# Altium footprint library TriggersLib.PcbLib: 262 footprints (part 4 of 17)
Each footprint in its own frame and in the unit in brackets; x right, y up, seen from the top. Pads: shape width x height; smd on the part's side, far side on the other; paste and mask are expansions set on the pad; w line width, h text height; cw(c..) or ccw(c..) is an arc to the next point about the centre after c.
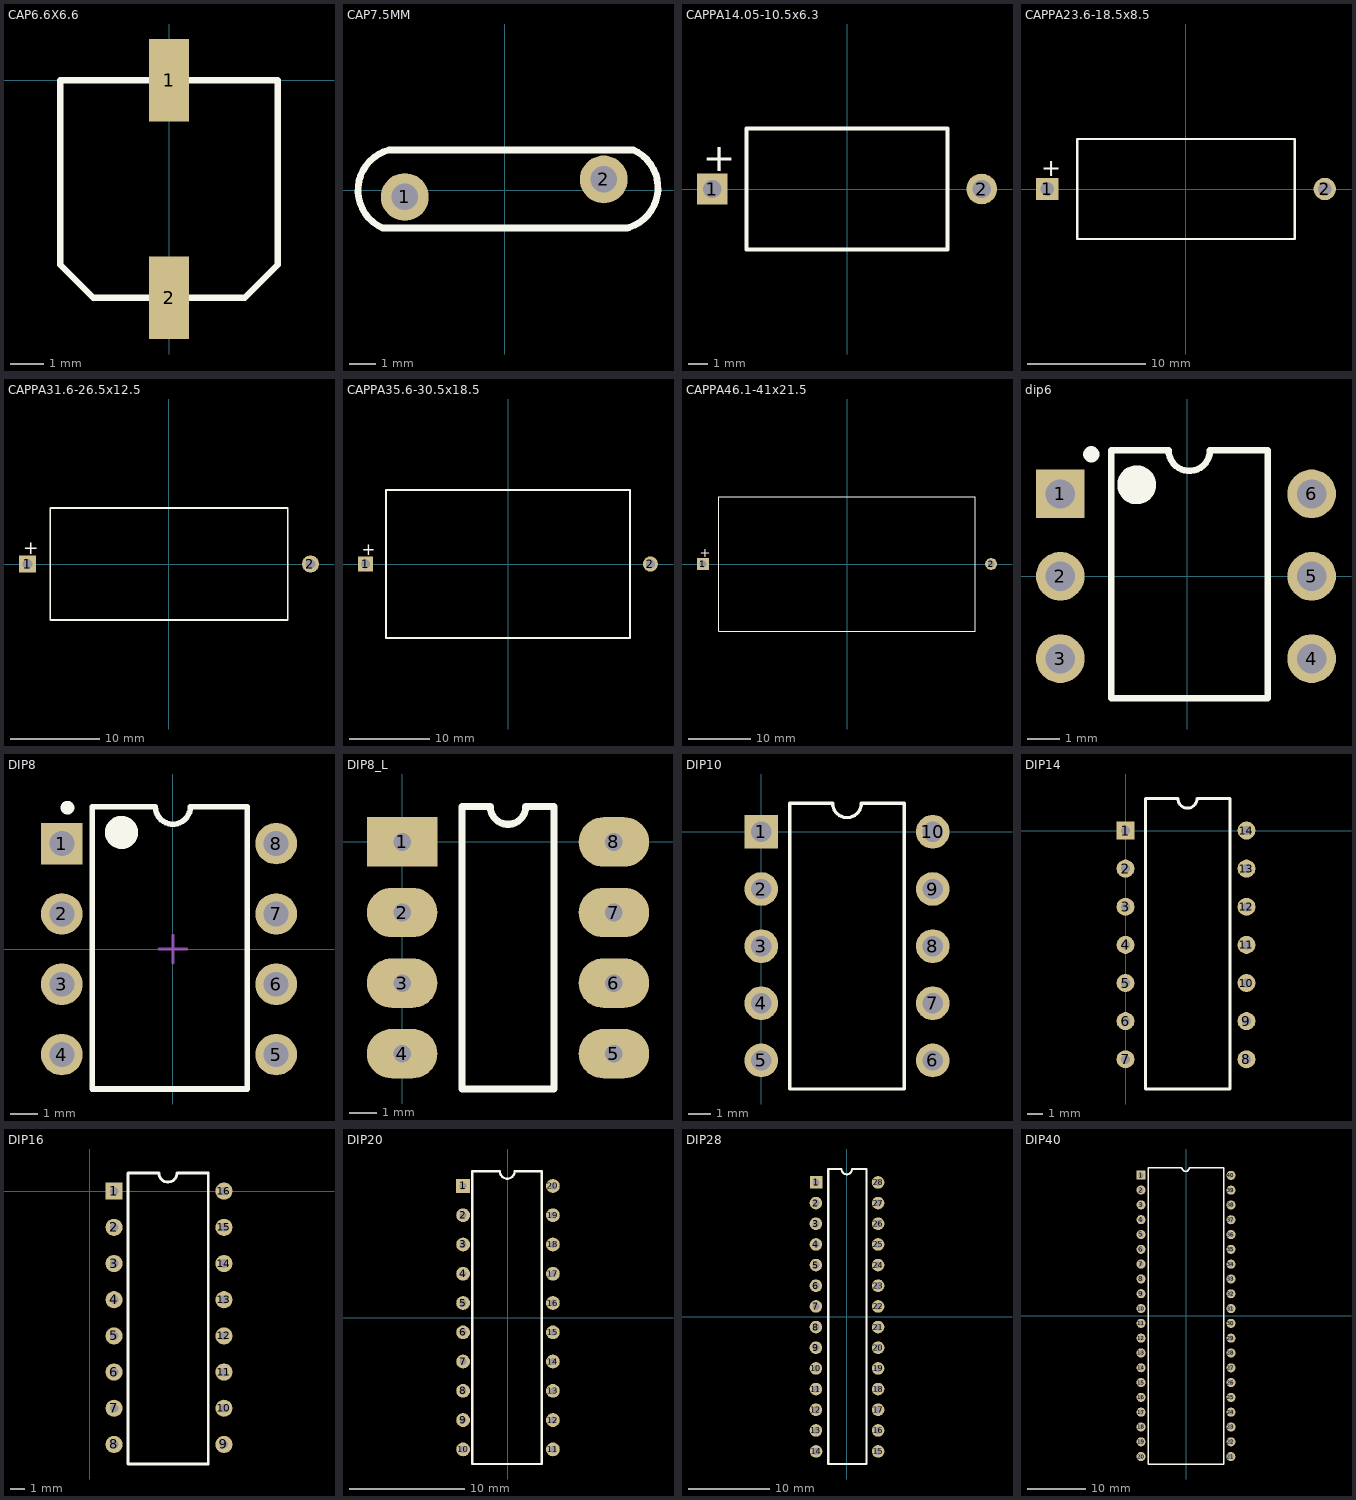
[diagram p3: the footprints below, top view; thin cyan lines are the x and y axes]

## CAP6.6X6.6 [mm] "SMDC"
pads (2):
  rect 1.2x2.5 smd: 1(0,0) 2(0,-6.6)
Top Overlay:
  lines w0.2: -3.3,-5.6 -2.3,-6.6 2.3,-6.6 3.3,-5.6 3.3,0 0,0 -3.3,0 -3.3,-5.6
3D body "SL-E.STEP": height 5.2, standoff 0, extent -3.275,-6.802 3.325,0.198

## CAP7.5MM [mm]
pads (2):
  round 1.8 hole 1: 1(-3.759,-0.254) 2(3.734,0.406)
Top Overlay:
  lines w0.254: 4.623,-1.425 -4.597,-1.425 cw(c-3.958,0.003) -4.357,1.516 4.851,1.516 cw(c4.212,0.088) 4.69,-1.401
3D body "final MOV7,5.step": height 18.5, standoff 0, extent -5.5,-0.849 5.784,1

## CAPPA14.05-10.5x6.3 [mm] "Capacitor, Axial, Polarised; Body 10.5 x 6.3 mm (LxDia. max), Lead Dia. 0.6 mm (typ)"
height 5.08
pads (2):
  rect 1.6x1.6 hole 0.95: 1(-7.025,0)
  round 1.6 hole 0.95: 2(7.025,0)
Top Overlay:
  lines w0.2: -5.25,-3.15 5.25,-3.15 5.25,3.15 -5.25,3.15 -5.25,-3.15
  text "+" at -7.525,0.925 h1.5
3D body "CAPPA14.05.STEP": height 6, standoff -0.5, extent -7.379,-2.997 7.341,3.013

## CAPPA23.6-18.5x8.5 [mm] "Capacitor, Axial, Polarised; Body 18.5 x 8.5 mm (LxDia. max), Lead Dia. 0.8 mm (typ)"
height 5.08
pads (2):
  rect 1.9x1.9 hole 1.15: 1(-11.8,0)
  round 1.9 hole 1.15: 2(11.8,0)
Top Overlay:
  lines w0.2: -9.25,-4.25 -9.25,4.25 9.25,4.25 9.25,-4.25 -9.25,-4.25
  text "+" at -12.3,1.075 h1.5
3D body "CAPPA23.6.STEP": height 6, standoff -0.5, extent -12.049,-2.997 12.151,3.013

## CAPPA31.6-26.5x12.5 [mm] "Capacitor, Axial, Polarised; Body 26.5 x 12.5 mm (LxDia. max), Lead Dia. 0.8 mm (typ)"
height 5.08
pads (2):
  rect 1.9x1.9 hole 1.15: 1(-15.8,0)
  round 1.9 hole 1.15: 2(15.8,0)
Top Overlay:
  lines w0.2: -13.25,-6.25 13.25,-6.25 13.25,6.25 -13.25,6.25 -13.25,-6.25
  text "+" at -16.3,1.075 h1.5
3D body "CAPPA31.6.STEP": height 12, standoff -1, extent -16.122,-6.005 16.078,6.005

## CAPPA35.6-30.5x18.5 [mm] "Capacitor, Axial, Polarised; Body 30.5 x 18.5 mm (LxDia. max), Lead Dia. 0.8 mm (typ)"
height 5.08
pads (2):
  rect 1.9x1.9 hole 1.15: 1(-17.8,0)
  round 1.9 hole 1.15: 2(17.8,0)
Top Overlay:
  lines w0.2: -15.25,-9.25 -15.25,9.25 15.25,9.25 15.25,-9.25 -15.25,-9.25
  text "+" at -18.3,1.075 h1.5
3D body "CAPPA35.6.STEP": height 12, standoff -1, extent -18.091,-5.903 18.009,6.107

## CAPPA46.1-41x21.5 [mm] "Capacitor, Axial, Polarised; Body 41 x 21.5 mm (LxDia. max), Lead Dia. 0.8 mm (typ)"
height 5.08
pads (2):
  rect 1.9x1.9 hole 1.15: 1(-23.05,0)
  round 1.9 hole 1.15: 2(23.05,0)
Top Overlay:
  lines w0.2: -20.5,-10.75 20.5,-10.75 20.5,10.75 -20.5,10.75 -20.5,-10.75
  text "+" at -23.55,1.075 h1.5
3D body "CAPPA46.STEP": height 12, standoff -1, extent -23.208,-5.929 23.292,6.081

## dip6 [mm]
pads (6):
  rect 1.5x1.5 hole 0.9: 1(-3.912,2.54)
  round 1.5 hole 0.9: 2(-3.912,0) 3(-3.912,-2.54) 4(3.835,-2.54) 5(3.835,0) 6(3.835,2.54)
Top Overlay:
  circle w0.6: c-1.557,2.819 r0.3
  circle w0.25: c-2.957,3.759 r0.125
  lines w0.2: -2.349,-3.759 2.476,-3.759 2.476,3.88 0.699,3.88 cw(c0.064,3.88) -0.572,3.88 -2.349,3.88 -2.349,-3.759
3D body "DIP-6.STEP": height 4.31, standoff -3.28, extent -4.038,-3.991 3.962,4.089

## DIP8 [mm]
pads (8):
  rect 1.5x1.5 hole 0.9: 1(-4.013,3.81)
  round 1.5 hole 0.9: 2(-4.013,1.27) 3(-4.013,-1.27) 4(-4.013,-3.81) 5(3.734,-3.81) 6(3.734,-1.27) 7(3.734,1.27) 8(3.734,3.81)
Top Overlay:
  circle w0.6: c-1.854,4.216 r0.3
  circle w0.25: c-3.81,5.11 r0.125
  lines w0.2: -2.921,-5.055 2.692,-5.055 2.692,5.15 0.635,5.15 cw(c0,5.15) -0.635,5.15 -2.921,5.15 -2.921,-5.055
Mechanical 15:
  lines w0.1: -0.5,0 0.5,0 ; 0,-0.5 0,0.5
3D body "DIP8test.STEP": height 4.57, standoff -3.81, extent -4.062,-4.879 3.758,5.031

## DIP8_L [mil]
pads (8):
  rect 100x70 hole 25: 1(0,0)
  oval 100x70 hole 25: 2(0,-100) 3(0,-200) 4(0,-300) 5(300,-300) 6(300,-200) 7(300,-100) 8(300,0)
Top Overlay:
  lines w10: 85,-350 215,-350 215,50 175,50 cw(c150,50) 125,50 85,50 85,-350
3D body "DIP8(1).step": height 177.17, standoff -137.8, extent -5.54,-362.6 300,62.6

## DIP10 [mm]
pads (10):
  rect 1.5x1.5 hole 0.9: 1(0,0)
  round 1.5 hole 0.9: 2(0,-2.54) 3(0,-5.08) 4(0,-7.62) 5(0,-10.16) 6(7.62,-10.16) 7(7.62,-7.62) 8(7.62,-5.08) 9(7.62,-2.54) 10(7.62,0)
Top Overlay:
  lines w0.152: 1.27,-11.43 1.27,1.27 2.54,1.27 3.175,1.27 ccw(c3.81,1.27) 4.445,1.27 5.08,1.27 6.35,1.27 6.35,-11.43 1.27,-11.43

## DIP14 [mm]
pads (14):
  rect 1.2x1.2 hole 0.6: 1(0,0)
  round 1.2 hole 0.6: 2(0,-2.54) 3(0,-5.08) 4(0,-7.62) 5(0,-10.16) 6(0,-12.7) 7(0,-15.24) 8(8.062,-15.24) 9(8.062,-12.7) 10(8.062,-10.16) 11(8.062,-7.62) 12(8.062,-5.08) 13(8.062,-2.54) 14(8.062,0)
Top Overlay:
  lines w0.2: 1.321,-17.221 1.321,2.134 3.493,2.134 ccw(c4.128,2.134) 4.763,2.134 6.96,2.134 6.96,-17.221 1.321,-17.221
3D body "DIP14.step": height 4.19, standoff -2.67, extent 0.102,-17.12 7.976,1.93

## DIP16 [mm]
pads (16):
  rect 1.2x1.2 hole 0.6: 1(1.719,0)
  round 1.2 hole 0.6: 2(1.719,-2.54) 3(1.719,-5.08) 4(1.719,-7.62) 5(1.719,-10.16) 6(1.719,-12.7) 7(1.719,-15.24) 8(1.719,-17.78) 9(9.433,-17.78) 10(9.433,-15.24) 11(9.433,-12.7) 12(9.433,-10.16) 13(9.433,-7.62) 14(9.433,-5.08) 15(9.433,-2.54) 16(9.433,0)
Top Overlay:
  lines w0.2: 2.692,-19.152 2.692,1.27 4.865,1.27 ccw(c5.5,1.27) 6.135,1.27 8.331,1.27 8.331,-19.152 2.692,-19.152
3D body "User Library-DIP16-300.step": height 5.08, standoff -2.49, extent 1.552,-18.915 9.422,1.084

## DIP20 [mm]
pads (20):
  rect 1.2x1.2 hole 0.6: 1(-3.895,11.43)
  round 1.2 hole 0.6: 2(-3.895,8.89) 3(-3.895,6.35) 4(-3.895,3.81) 5(-3.895,1.27) 6(-3.895,-1.27) 7(-3.895,-3.81) 8(-3.895,-6.35) 9(-3.895,-8.89) 10(-3.895,-11.43) 11(3.895,-11.43) 12(3.895,-8.89) 13(3.895,-6.35) 14(3.895,-3.81) 15(3.895,-1.27) 16(3.895,1.27) 17(3.895,3.81) 18(3.895,6.35) 19(3.895,8.89) 20(3.895,11.43)
Top Overlay:
  lines w0.2: -3.1,-12.7 2.92,-12.7 2.92,12.7 0.572,12.7 cw(c-0.064,12.7) -0.699,12.7 -3.1,12.7 -3.1,-12.7
3D body "DIP-20-300.STEP": height 4.5, standoff -3.5, extent -3.907,-12.622 3.854,12.978

## DIP28 [mil]
pads (28):
  rect 61x61 hole 35: 1(-149.24,650.1)
  round 61 hole 35: 2(-150.36,550.19) 3(-150.36,450.29) 4(-150.36,350.39) 5(-150.36,250.48) 6(-150.36,150.58) 7(-150.36,50.68) 8(-150.36,-49.23) 9(-150.36,-149.13) 10(-150.36,-249.04) 11(-150.36,-348.94) 12(-150.36,-448.84) 13(-150.36,-548.75) 14(-149.24,-650.1) 15(150.36,-650.1) 16(150.36,-548.75) 17(150.36,-448.84) 18(150.36,-348.94) 19(150.36,-249.04) 20(150.36,-149.13) 21(150.36,-49.23) 22(150.36,50.68) 23(150.36,150.58) 24(150.36,250.48) 25(150.36,350.39) 26(150.36,450.29) 27(150.36,550.19) 28(149.97,650.1)
Top Overlay:
  lines w10: -26.21,714.29 -90.63,714.29 -90.63,-711.12 93.87,-711.12 93.87,715.28 24.97,715.28 ; -26.01,714.08 ccw(c-1.01,714.08) 23.99,714.08
3D body "DIP28-300.step": height 200, standoff -98.03, extent -155.54,-708.17 154.31,709.15

## DIP40 [mil]
pads (40):
  rect 61x61 hole 35: 1(-303.88,950.19)
  round 61 hole 35: 2(-303.62,850.17) 3(-303.62,750.15) 4(-303.62,650.13) 5(-303.62,550.11) 6(-303.62,450.09) 7(-303.62,350.07) 8(-303.62,250.05) 9(-303.62,150.03) 10(-303.62,50.01) 11(-303.62,-50.01) 12(-303.62,-150.03) 13(-303.62,-250.05) 14(-303.62,-350.07) 15(-303.62,-450.09) 16(-303.62,-550.11) 17(-303.62,-650.13) 18(-303.62,-750.15) 19(-303.62,-850.17) 20(-303.62,-950.19) 21(303.04,-950.19) 22(303.88,-850.21) 23(303.88,-750.23) 24(303.88,-650.25) 25(303.88,-550.28) 26(303.88,-450.3) 27(303.88,-350.32) 28(303.88,-250.34) 29(303.88,-150.36) 30(303.88,-50.39) 31(303.88,49.59) 32(303.88,149.57) 33(303.88,249.55) 34(303.88,349.53) 35(303.88,449.5) 36(303.88,549.48) 37(303.88,649.46) 38(303.88,749.44) 39(303.88,849.42) 40(303.88,949.39)
Top Overlay:
  lines w10: -254.04,-1000.19 253.88,-1000.19 253.88,1001.06 21.79,1001.06 cw(c-3.21,1001.06) -28.21,1001.06 -254.04,1001.06 -254.04,-1000.19
3D body "DIP40.step": height 224.41, standoff -101.57, extent -303.72,-1026.29 306.12,1038.67